# Altium footprint library XU-GENARAL PCB .PcbLib: 1176 footprints (part 48 of 75)
Each footprint in its own frame and in the unit in brackets; x right, y up, seen from the top. Pads: shape width x height; smd on the part's side, far side on the other; paste and mask are expansions set on the pad; w line width, h text height; cw(c..) or ccw(c..) is an arc to the next point about the centre after c.
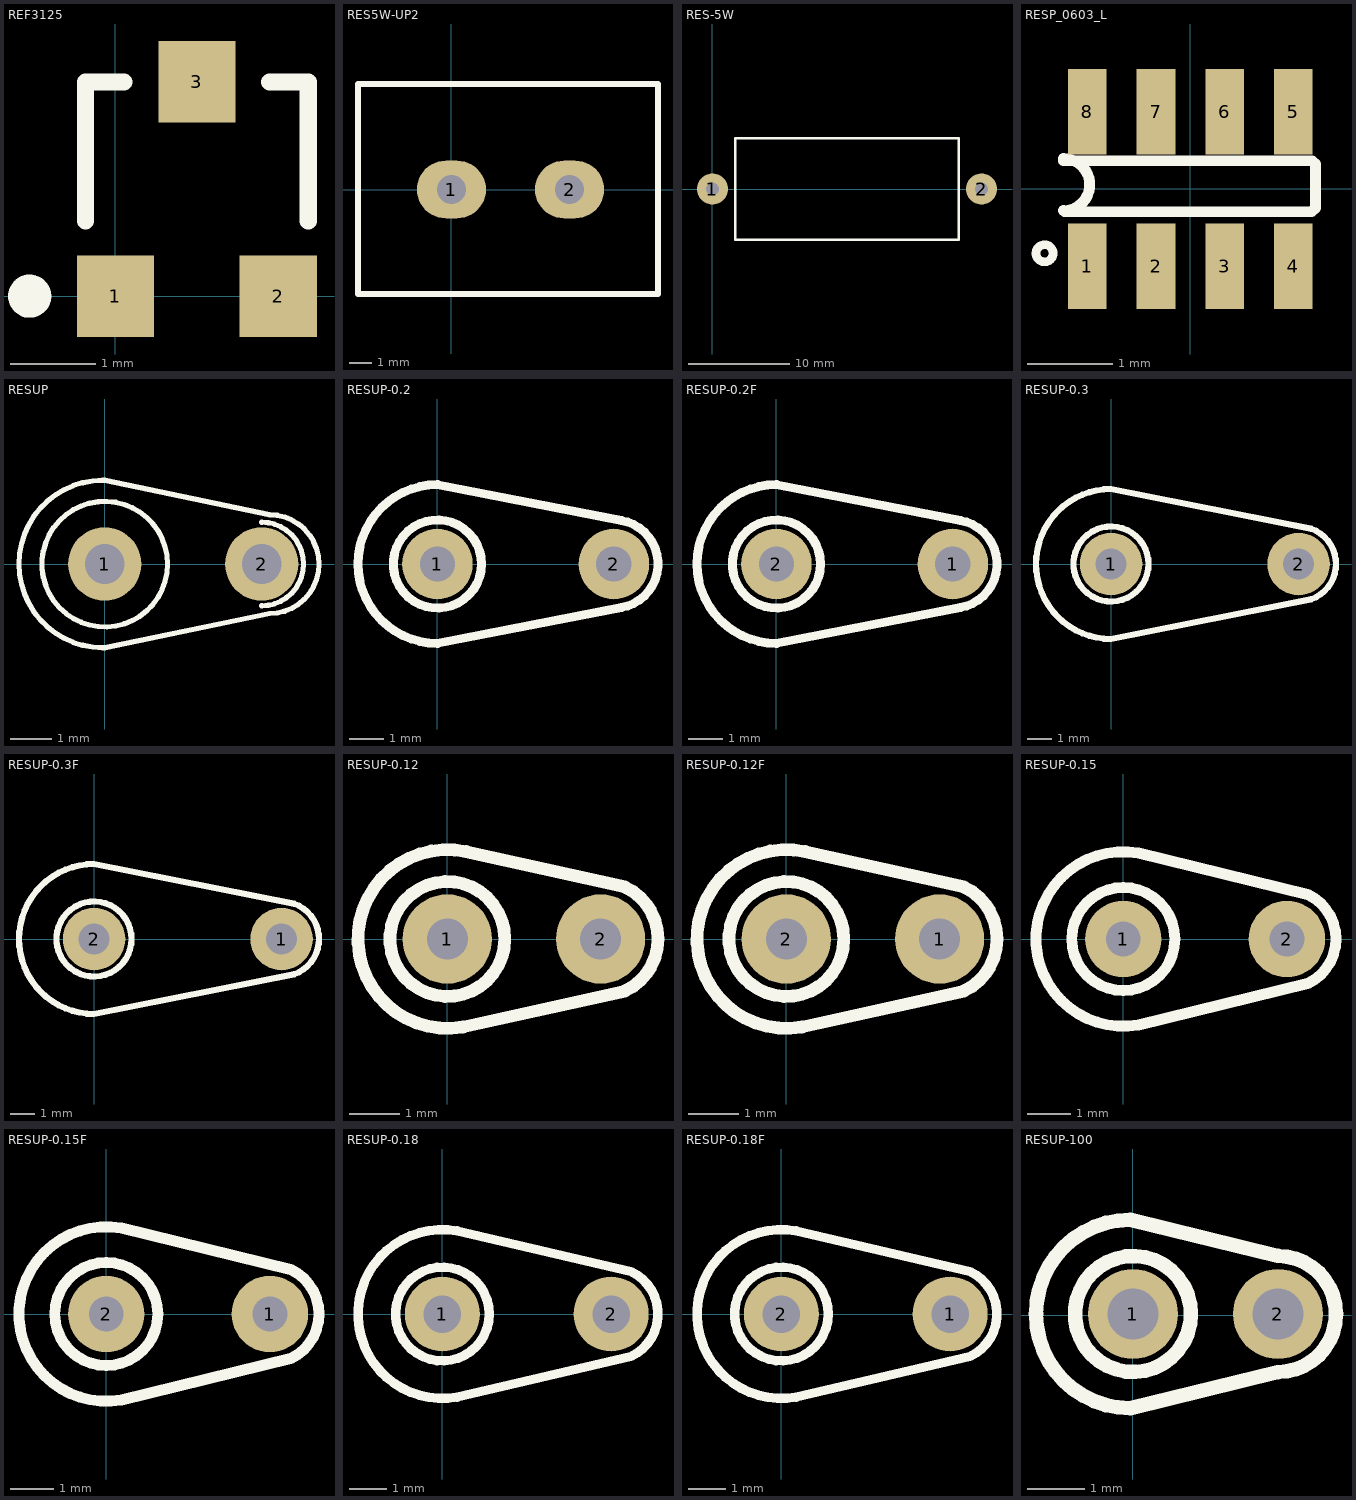
[diagram p47: the footprints below, top view; thin cyan lines are the x and y axes]

## REF3125 [mm]
height 6.8
pads (3):
  rect 0.9x0.95 smd: 1(0,0) 2(1.9,0) 3(0.95,2.5)
Top Overlay:
  circle w0.254: c-1,0 r0.125
  lines w0.2: -0.35,0.875 -0.35,2.5 0.1,2.5 ; 1.8,2.5 2.25,2.5 2.25,0.875

## RES5W-UP2 [mil]
pads (2):
  oval 120x100 hole 50: 1(-0.05,0.14) 2(204.67,0.14)
Top Overlay:
  lines w10: 357.95,182.14 357.95,-180.86 99.95,-180.71 -161.9,-180.71 -162.05,183.14 357.95,183.14

## RES-5W [mil]
pads (2):
  round 120 hole 50: 1(0,0) 2(1043.31,0)
Top Overlay:
  lines w10: 88.58,-196.85 88.58,196.85 954.72,196.85 954.72,-196.85 88.58,-196.85

## RESP_0603_L [mm] "Chip Resistor Array, (0603x4); SM; 8 Leads; Body 3.40 x 1.80 mm (LxW max)"
height 0.7
pads (8):
  rect 0.45x1 smd: 1(-1.2,-0.9) 2(-0.4,-0.9) 3(0.4,-0.9) 4(1.2,-0.9) 5(1.2,0.9) 6(0.4,0.9) 7(-0.4,0.9) 8(-1.2,0.9)
Top Overlay:
  circle w0.1: c-1.7,-0.75 r0.1
  lines w0.127: -1.477,0.33 1.422,0.33 1.462,0.29 1.462,-0.22 1.416,-0.266 -1.464,-0.266 -1.477,-0.253 ccw(c-1.477,0.051) -1.477,0.355

## RESUP [mil]
pads (2):
  round 70 hole 38: 1(-0.05,0.14) 2(149.95,0.14)
Top Overlay:
  circle w5: c0,0 r60
  lines w5: -1.94,-79.86 cw(c-1.94,0.14) -1.94,80.14 ; -0.05,-79.86 157.48,-47.24 ccw(c157.48,0) 157.48,47.24 -0.05,80.14 ; 149.95,-39.86 ccw(c149.95,0.14) 189.95,0.14 ccw(c149.95,0.14) 149.95,40.14

## RESUP-0.2 [mil]
pads (2):
  round 80 hole 40: 1(0,0) 2(200,0)
Top Overlay:
  circle w10: c0,0 r50
  lines w10: 0,-90 cw(c0,0) 0,90 208.68,49.24 cw(c200,0) 208.68,-49.24 0,-90

## RESUP-0.2F [mil]
pads (2):
  round 80 hole 40: 1(200,0) 2(0,0)
Top Overlay:
  circle w10: c0,0 r50
  lines w10: 0,-90 cw(c0,0) 0,90 208.68,49.24 cw(c200,0) 208.68,-49.24 0,-90

## RESUP-0.3 [mil]
pads (2):
  round 100 hole 50: 1(0,0) 2(300,-0.07)
Top Overlay:
  circle w10: c0,0 r60
  lines w10: 0,-120 cw(c0,0) 0,120 320.52,56.38 cw(c300,0) 320.52,-56.38 0,-120

## RESUP-0.3F [mil]
pads (2):
  round 100 hole 50: 1(300,-0.07) 2(0,0)
Top Overlay:
  circle w10: c0,0 r60
  lines w10: 0,-120 cw(c0,0) 0,120 320.52,56.38 cw(c300,0) 320.52,-56.38 0,-120

## RESUP-0.12 [mil]
pads (2):
  round 70 hole 32: 1(0,0) 2(120,0)
Top Overlay:
  circle w10: c0,0 r45
  lines w10: 12.16,-68.94 cw(c0,0) 14.55,68.47 139.02,40.78 cw(c120,0) 139.02,-40.78 12.16,-68.94

## RESUP-0.12F [mil]
pads (2):
  round 70 hole 32: 1(120,0) 2(0,0)
Top Overlay:
  circle w10: c0,0 r45
  lines w10: 12.16,-68.94 cw(c0,0) 14.55,68.47 139.02,40.78 cw(c120,0) 139.02,-40.78 12.16,-68.94

## RESUP-0.15 [mil]
pads (2):
  round 70 hole 32: 1(0,0) 2(150,0)
Top Overlay:
  circle w10: c0,0 r47.24
  lines w10: 13.89,-78.78 cw(c0,0) 13.89,78.78 169.02,40.78 cw(c150,0) 169.02,-40.78 13.89,-78.78

## RESUP-0.15F [mil]
pads (2):
  round 70 hole 32: 1(150,0) 2(0,0)
Top Overlay:
  circle w10: c0,0 r47.24
  lines w10: 13.89,-78.78 cw(c0,0) 13.89,78.78 169.02,40.78 cw(c150,0) 169.02,-40.78 13.89,-78.78

## RESUP-0.18 [mil]
pads (2):
  round 80 hole 40: 1(0,0) 2(180,0)
Top Overlay:
  circle w10: c0,0 r50
  lines w10: 15.63,-88.63 cw(c0,0) 15.63,88.63 201.13,45.32 cw(c180,0) 201.13,-45.32 15.63,-88.63

## RESUP-0.18F [mil]
pads (2):
  round 80 hole 40: 1(180,0) 2(0,0)
Top Overlay:
  circle w10: c0,0 r50
  lines w10: 15.63,-88.63 cw(c0,0) 15.63,88.63 201.13,45.32 cw(c180,0) 201.13,-45.32 15.63,-88.63

## RESUP-100 [mil]
pads (2):
  round 62 hole 35: 1(0,1) 2(100,1)
Top Overlay:
  circle w10: c0,1 r40
  lines w10: -1.89,-64 cw(c-1.89,1) -1.89,66 100,41 cw(c100,1) 140,1 cw(c100,1) 100,-39 -1.89,-64